# Altium footprint library MYS-Library.PcbLib: 94 footprints (part 3 of 6)
Each footprint in its own frame and in the unit in brackets; x right, y up, seen from the top. Pads: shape width x height; smd on the part's side, far side on the other; paste and mask are expansions set on the pad; w line width, h text height; cw(c..) or ccw(c..) is an arc to the next point about the centre after c.
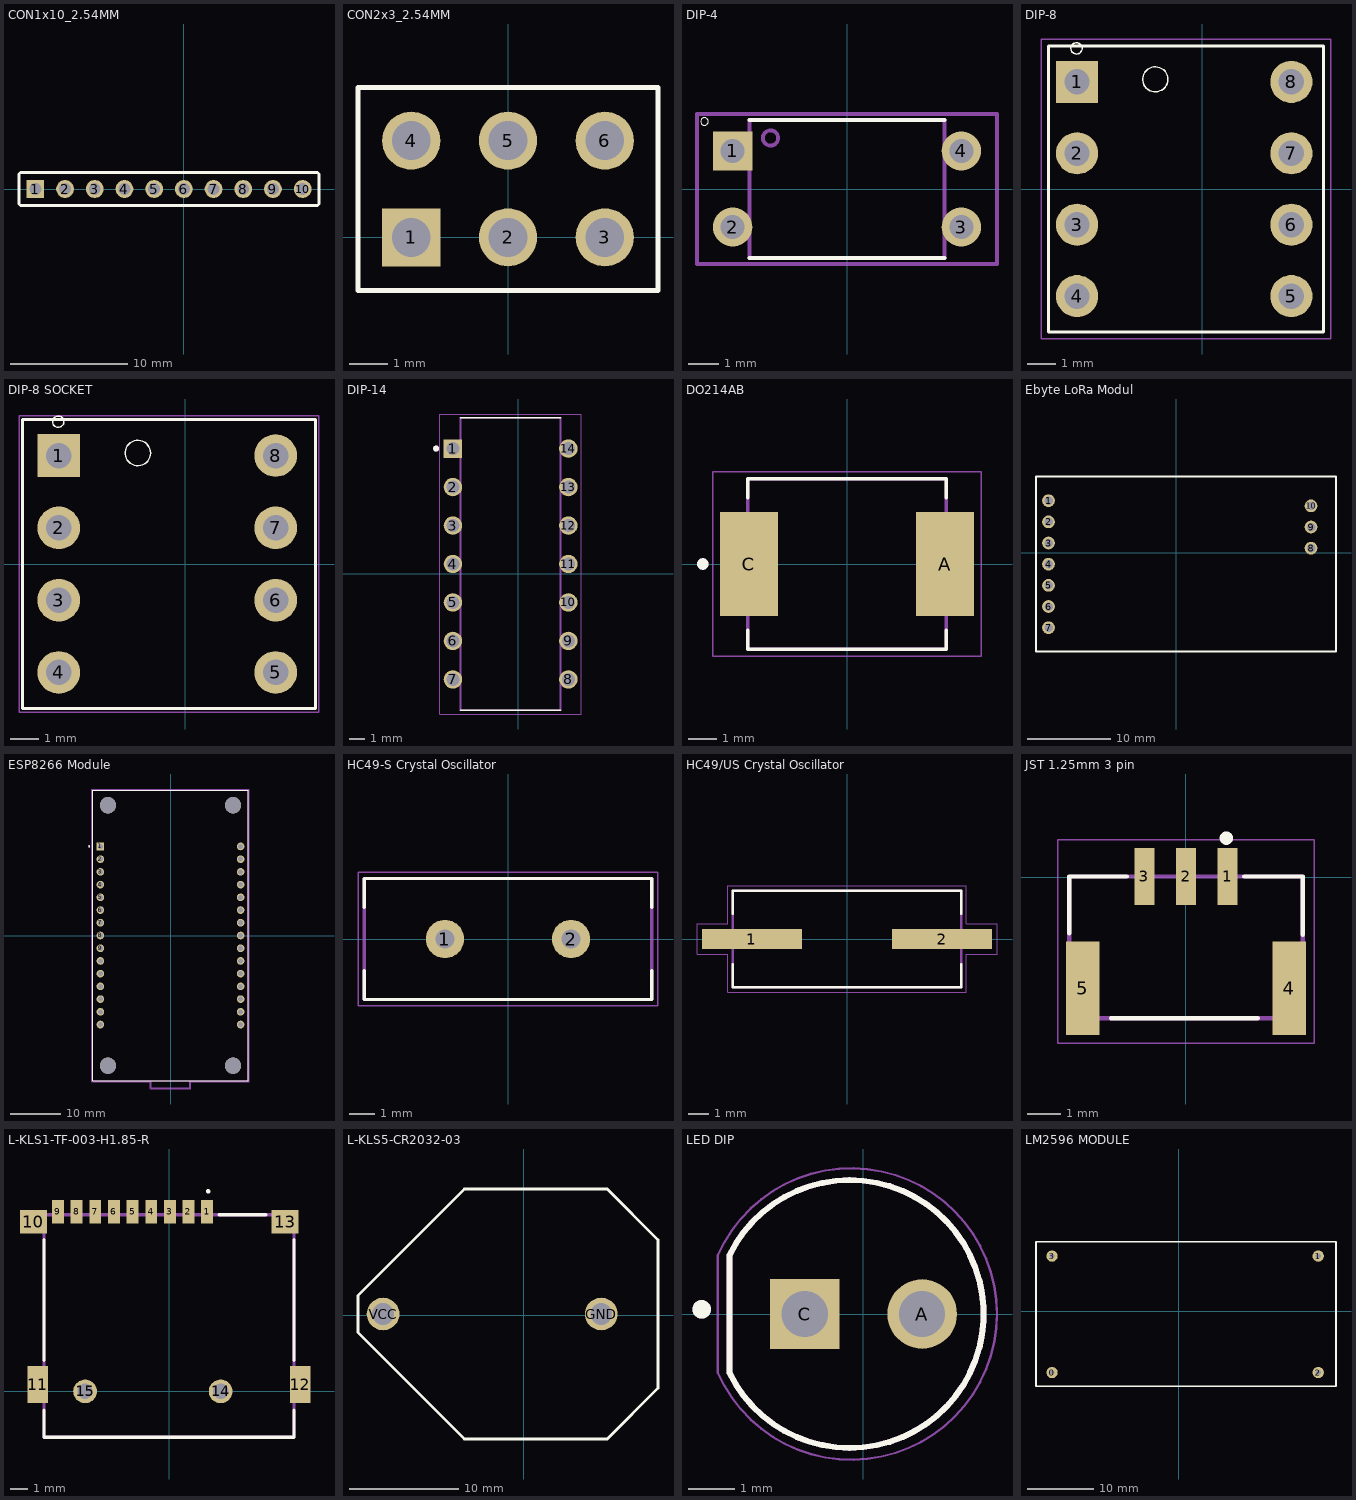
[diagram p2: the footprints below, top view; thin cyan lines are the x and y axes]

## CON1x10_2.54MM [mil]
pads (10):
  rect 60x60 hole 40.16: 1(-500,0)
  round 60 hole 40.16: 2(-400,0) 3(-300,0) 4(-200,0) 5(-100,0) 6(0,0) 7(100,0) 8(200,0) 9(300,0) 10(400,0)
Top Overlay:
  lines w10: -555,-50 -555,50 ; -550,-55 450,-55 ; -550,55 450,55 ; 455,-50 455,50
3D body "zl201-10_p2-54_l25-4_w2-54_h8-9.stp": height 350, standoff -120, extent -550,-50 450,50

## CON2x3_2.54MM [mil]
pads (6):
  rect 60x60 hole 40.16: 1(-100,0)
  round 60 hole 40.16: 2(0,0) 3(100,0) 4(-100,100) 5(0,100) 6(100,100)
Top Overlay:
  lines w5: -155,-55 -155,155 155,155 155,-55 -155,-55
3D body "zl201-3_p2-54_l7-62_w2-54_h8-89.stp": height 350, standoff -120, extent -150,50 150,150
3D body "zl201-3_p2-54_l7-62_w2-54_h8-89.stp": height 350, standoff -120, extent -150,-50 150,50

## DIP-4 [mm]
pads (4):
  rect 1.308x1.308 hole 0.8: 1(-3.81,1.27)
  round 1.308 hole 0.8: 2(-3.81,-1.27) 3(3.81,-1.27) 4(3.81,1.27)
Top Overlay:
  circle w0: c-4.75,2.25 r0.127
  lines w0.127: -3.25,-2.3 3.25,-2.3 ; -3.25,2.3 3.25,2.3
Mechanical 13:
  circle w0.127: c-2.55,1.7 r0.254
  lines w0.127: -3.25,-2.3 -3.25,2.3 ; 3.25,-2.3 3.25,2.3
Mechanical 15:
  lines w0.127: -5,-2.5 -5,2.5 5,2.5 5,-2.5 -5,-2.5
3D body "EL817(C).STEP": height 4.8, standoff -3.81, extent -4.062,-2.29 3.808,2.29

## DIP-8 [mm]
pads (8):
  rect 1.5x1.5 / inner round 1.5 / far side rect 1.5x1.5 hole 0.9: 1(-4.445,3.81)
  round 1.5 hole 0.9: 2(-4.445,1.27) 3(-4.445,-1.27) 4(-4.445,-3.81) 5(3.175,-3.81) 6(3.175,-1.27) 7(3.175,1.27) 8(3.175,3.81)
Top Overlay:
  circle w0.05: c-1.665,3.9 r0.447
  circle w0.05: c-4.465,5 r0.2
  lines w0.1: -5.461,-5.08 4.318,-5.08 4.318,5.08 -5.461,5.08 -5.461,-5.08
Mechanical 15:
  lines w0.05: -5.715,-5.334 4.572,-5.334 4.572,5.334 -5.715,5.334 -5.715,-5.334
3D body "step_temp.STEP": height 4.85, standoff -2.51, extent -4.443,-4.83 3.427,4.83

## DIP-8 SOCKET [mm]
pads (8):
  rect 1.5x1.5 / inner round 1.5 / far side rect 1.5x1.5 hole 0.9: 1(-4.445,3.81)
  round 1.5 hole 0.9: 2(-4.445,1.27) 3(-4.445,-1.27) 4(-4.445,-3.81) 5(3.175,-3.81) 6(3.175,-1.27) 7(3.175,1.27) 8(3.175,3.81)
Top Overlay:
  circle w0.05: c-4.465,5 r0.2
  circle w0.05: c-1.665,3.9 r0.447
  lines w0.1: -5.715,-5.08 -5.715,5.08 4.572,5.08 4.572,-5.08 -5.715,-5.08
Mechanical 15:
  lines w0.05: -5.842,-5.207 -5.842,5.207 4.699,5.207 4.699,-5.207 -5.842,-5.207
3D body "step_temp.STEP": height 8.35, standoff 0.99, extent -4.443,-4.83 3.427,4.83
3D body "SCSM-8.step": height 4.5, standoff -2.9, extent -5.651,-5.08 4.508,5.08

## DIP-14 [mm]
pads (14):
  rect 1.22x1.22 hole 0.87: 1(-4.318,8.255)
  round 1.22 hole 0.87: 2(-4.318,5.715) 3(-4.318,3.175) 4(-4.318,0.635) 5(-4.318,-1.905) 6(-4.318,-4.445) 7(-4.318,-6.985) 8(3.302,-6.985) 9(3.302,-4.445) 10(3.302,-1.905) 11(3.302,0.635) 12(3.302,3.175) 13(3.302,5.715) 14(3.302,8.255)
Top Overlay:
  circle w0.2: c-5.428,8.255 r0.1
  lines w0.127: -3.811,-9.018 2.795,-9.018 ; -3.811,10.288 2.795,10.288
Mechanical 13:
  circle w0.2: c-5.428,8.255 r0.1
  lines w0.127: -3.811,-9.018 2.795,-9.018 2.795,10.288 -3.811,10.288 -3.811,-9.018
Mechanical 15:
  lines w0.05: -5.178,-9.267 4.162,-9.267 4.162,10.537 -5.178,10.537 -5.178,-9.267
3D body "step_temp.STEP": height 5.33, standoff -4.06, extent -4.464,-9.017 3.448,10.287

## DO214AB [mm]
pads (2):
  rect 2x3.6 smd: A(3.4,0) C(-3.4,0)
Top Overlay:
  circle w0.2: c-5,0 r0.1
  lines w0.127: -3.437,-2.3 -3.437,-2.95 3.437,-2.95 3.437,-2.3 ; -3.437,2.3 -3.437,2.95 3.437,2.95 3.437,2.3
Mechanical 13:
  circle w0.2: c-5,0 r0.1
  lines w0.127: -3.437,-2.95 3.437,-2.95 3.437,2.95 -3.437,2.95 -3.437,-2.95
Mechanical 15:
  lines w0.05: -4.65,-3.2 4.65,-3.2 4.65,3.2 -4.65,3.2 -4.65,-3.2
3D body "SS36.STEP": height 2.65, standoff 0, extent -3.975,-2.95 3.975,2.95

## Ebyte LoRa Modul [mm] "Modul"
pads (10):
  round 1.524 hole 1.02: 1(-15.3,6.24) 2(-15.3,3.7) 3(-15.3,1.16) 4(-15.3,-1.38) 5(-15.3,-3.92) 6(-15.3,-6.46) 7(-15.3,-9) 8(16.2,0.54) 9(16.2,3.08) 10(16.2,5.62)
Top Overlay:
  lines w0.254: -16.805,-11.856 -16.805,9.144 19.195,9.144 19.195,-11.856 -16.805,-11.856
3D body "E32-TTL-100.step": height 8.71, standoff -5.83, extent -16.775,-11.9 32.005,9.1

## ESP8266 Module [mm] "Module"
pads (34):
  rect 1.53x1.53 hole 1.02: 1(-14,17.88)
  round 1.53 hole 1.02: 2(-14,15.34) 3(-14,12.8) 4(-14,10.26) 5(-14,7.72) 6(-14,5.18) 7(-14,2.64) 8(-14,0.1) 9(-14,-2.44) 10(-14,-4.98) 11(-14,-7.52) 12(-14,-10.06) 13(-14,-12.6) 14(-14,-15.14) 15(-14,-17.68) 16(14,-17.68) 17(14,-15.14) 18(14,-12.6) 19(14,-10.06) 20(14,-7.52) 21(14,-4.98) 22(14,-2.44) 23(14,0.1) 24(14,2.64) 25(14,5.18) 26(14,7.72) 27(14,10.26) 28(14,12.8) 29(14,15.34) 30(14,17.88)
  round 3.25 hole 3.25 unplated: ""(-12.5,-25.9) ""(-12.5,26.1) ""(12.5,-25.9) ""(12.5,26.1)
Top Overlay:
  circle w0.2: c-16.25,17.88 r0.1
  lines w0.127: -15.5,-28.9 -15.5,29.1 15.5,29.1 15.5,-28.9 -15.5,-28.9
Mechanical 13:
  circle w0.2: c-16.25,17.88 r0.1
  lines w0.127: -3.81,-28.9 -3.81,-30.3 3.81,-30.3 3.81,-28.9 ; -15.5,-28.9 -15.5,29.1 15.5,29.1 15.5,-28.9 -15.5,-28.9
Mechanical 15:
  lines w0.05: -15.75,-29.15 -15.75,29.35 15.75,29.35 15.75,-29.15 4.06,-29.15 4.06,-30.55 -4.06,-30.55 -4.06,-29.15 -15.75,-29.15
3D body "Lolin NodeMCU ESP8266 V3.STEP": height 7.6, standoff -5.54, extent -15.75,-30.815 15.75,29.165

## HC49-S Crystal Oscillator [mil]
pads (2):
  round 60 hole 30: 1(-98.43,0) 2(98.43,0)
Top Overlay:
  lines w5: -224.41,-49.37 -224.41,-94.49 224.41,-94.49 224.41,-49.37 ; -224.41,49.37 -224.41,94.49 224.41,94.49 224.41,49.37
Mechanical 13:
  lines w5: -224.41,-94.49 224.41,-94.49 224.41,94.49 -224.41,94.49 -224.41,-94.49
Mechanical 15:
  lines w1.97: -234.25,-104.33 -234.25,-30 -234.25,30 -234.25,104.33 234.25,104.33 234.25,30 234.25,-30 234.25,-104.33 -234.25,-104.33
3D body "Crystal Resonator HC-49S.STEP": height 144.88, standoff -137.8, extent -226.38,-98.43 226.38,98.43

## HC49/US Crystal Oscillator [mm]
pads (2):
  rect 5x1 smd: 1(-4.75,0) 2(4.75,0)
Top Overlay:
  lines w0.127: -5.7,-1.254 -5.7,-2.4 5.7,-2.4 5.7,-1.254 ; -5.7,1.254 -5.7,2.4 5.7,2.4 5.7,1.254
Mechanical 13:
  lines w0.127: -5.7,-2.4 -5.7,2.4 5.7,2.4 5.7,-2.4 -5.7,-2.4
Mechanical 15:
  lines w0.05: -7.493,-0.762 -5.95,-0.762 -5.95,-2.65 5.95,-2.65 5.95,-0.762 7.493,-0.762 7.493,0.762 5.95,0.762 5.95,2.65 -5.95,2.65 -5.95,0.762 -7.493,0.762 -7.493,-0.762
3D body "8MHz.STEP": height 4.01, standoff -0.1, extent -6.373,-2.223 6.627,2.477

## JST 1.25mm 3 pin [mm]
pads (5):
  rect 0.6x1.7 smd: 1(1.253,0.021) 2(0.003,0.021) 3(-1.247,0.021)
  rect 1x2.8 smd: 4(3.103,-3.329) 5(-3.097,-3.329)
Top Overlay:
  circle w0.2: c1.213,1.171 r0.1
  lines w0.127: -3.497,-1.679 -3.497,0.021 -1.775,0.021 ; -2.247,-4.229 2.153,-4.229 ; 1.753,0.021 3.503,0.021 3.503,-1.729
Mechanical 13:
  lines w0.127: -3.497,-4.229 -3.497,0.021 3.503,0.021 3.503,-4.229 -3.497,-4.229
Mechanical 15:
  lines w0.05: -3.847,-4.979 -3.847,1.121 3.853,1.121 3.853,-4.979 -3.847,-4.979
3D body "BM03B-GHS-TBT-LF--SN--N---3DModel-STEP-56544.STEP": height 4.2, standoff 0, extent -3.5,-4.538 3.5,0.412

## L-KLS1-TF-003-H1.85-R [mm]
pads (15):
  rect 0.7x1.4 smd: 1(2.25,10.6) 2(1.15,10.6) 3(0.05,10.6) 4(-1.05,10.6) 5(-2.15,10.6) 6(-3.25,10.6) 7(-4.35,10.6) 8(-5.45,10.6) 9(-6.55,10.6)
  rect 1.6x1.4 smd: 10(-8,10) 13(6.85,10)
  rect 1.2x2.2 smd: 11(-7.75,0.4) 12(7.75,0.4)
  round 1.4 hole 0.9: 14(3.05,0) 15(-4.95,0)
Top Overlay:
  circle w0.2: c2.311,11.802 r0.034
  lines w0.2: -7.375,-1.104 -7.375,-2.706 7.375,-2.706 7.375,-1.104 ; -7.375,1.835 -7.375,8.95 ; 2.95,10.431 5.698,10.431 ; 7.375,1.835 7.375,8.95
Mechanical 13:
  lines w0.2: -7.375,-2.706 -7.375,10.431 7.375,10.431 7.375,-2.706 -7.375,-2.706
3D body "L-KLS1-TF-003-H1.85-R.stp": height 1.85, standoff -0.6, extent -8,-3.99 8.1,11.213

## L-KLS5-CR2032-03 [mm]
pads (2):
  round 3 hole 2: GND(7.1,0.1) VCC(-12.9,0.1)
Top Overlay:
  lines w0.254: -15.2,-1.6 -5.45,-11.35 7.65,-11.35 12.3,-6.7 12.3,6.9 7.65,11.55 -5.45,11.55 -15.2,1.8 -15.2,-1.6
3D body "KLS5-CR2032.stp": height 10.51, standoff -2.7, extent -15.2,-11.35 12.3,11.55

## LED DIP [mm]
pads (2):
  round 1.508 hole 1: A(1.27,0)
  rect 1.508x1.508 / inner round 1.508 / far side rect 1.508x1.508 hole 1: C(-1.27,0)
Top Overlay:
  circle w0.2: c-3.5,0.1 r0.1
  lines w0.127: -2.9,-1.27 ccw(c-0.296,0) -2.9,1.27 -2.9,-1.27
Mechanical 13:
  circle w0.2: c-3.5,0.1 r0.1
  lines w0.127: -2.9,-1.27 ccw(c-0.296,0) -2.9,1.27 -2.9,-1.27
Mechanical 15:
  lines w0.05: -3.15,-1.27 -3.15,1.27 ; -3.144,-1.283 ccw(c-0.264,0) -3.144,1.283
3D body "step_temp.STEP": height 9.6, standoff -25.9, extent -2.9,-2.9 2.51,2.9

## LM2596 MODULE [mm]
pads (4):
  round 1.7 hole 0.762: 0(-19.05,-9.245) 1(20.95,8.255) 2(20.95,-9.245) 3(-19.05,8.255)
Top Overlay:
  lines w0.254: -21.463,-11.303 -20.828,-11.303 23.622,-11.303 23.622,10.414 -21.463,10.414 -21.463,-11.303 ; -21.463,-11.303 -21.463,-11.303
3D body "LM2596.step": height 15.48, standoff 2.37, extent -20.984,-10.967 23.016,10.033
3D body "zl201-1_p2-54_l2-54_w2-54_h8-89.stp": height 8.89, standoff -3.05, extent 19.68,6.985 22.22,9.525
3D body "zl201-1_p2-54_l2-54_w2-54_h8-89.stp": height 8.89, standoff -3.05, extent 19.68,-10.515 22.22,-7.975
3D body "zl201-1_p2-54_l2-54_w2-54_h8-89.stp": height 8.89, standoff -3.05, extent -20.32,-10.515 -17.78,-7.975
3D body "zl201-1_p2-54_l2-54_w2-54_h8-89.stp": height 8.89, standoff -3.05, extent -20.32,6.985 -17.78,9.525